# Altium footprint library TarabusLib_KOR.PcbLib: 560 footprints (part 21 of 35)
Each footprint in its own frame and in the unit in brackets; x right, y up, seen from the top. Pads: shape width x height; smd on the part's side, far side on the other; paste and mask are expansions set on the pad; w line width, h text height; cw(c..) or ccw(c..) is an arc to the next point about the centre after c.
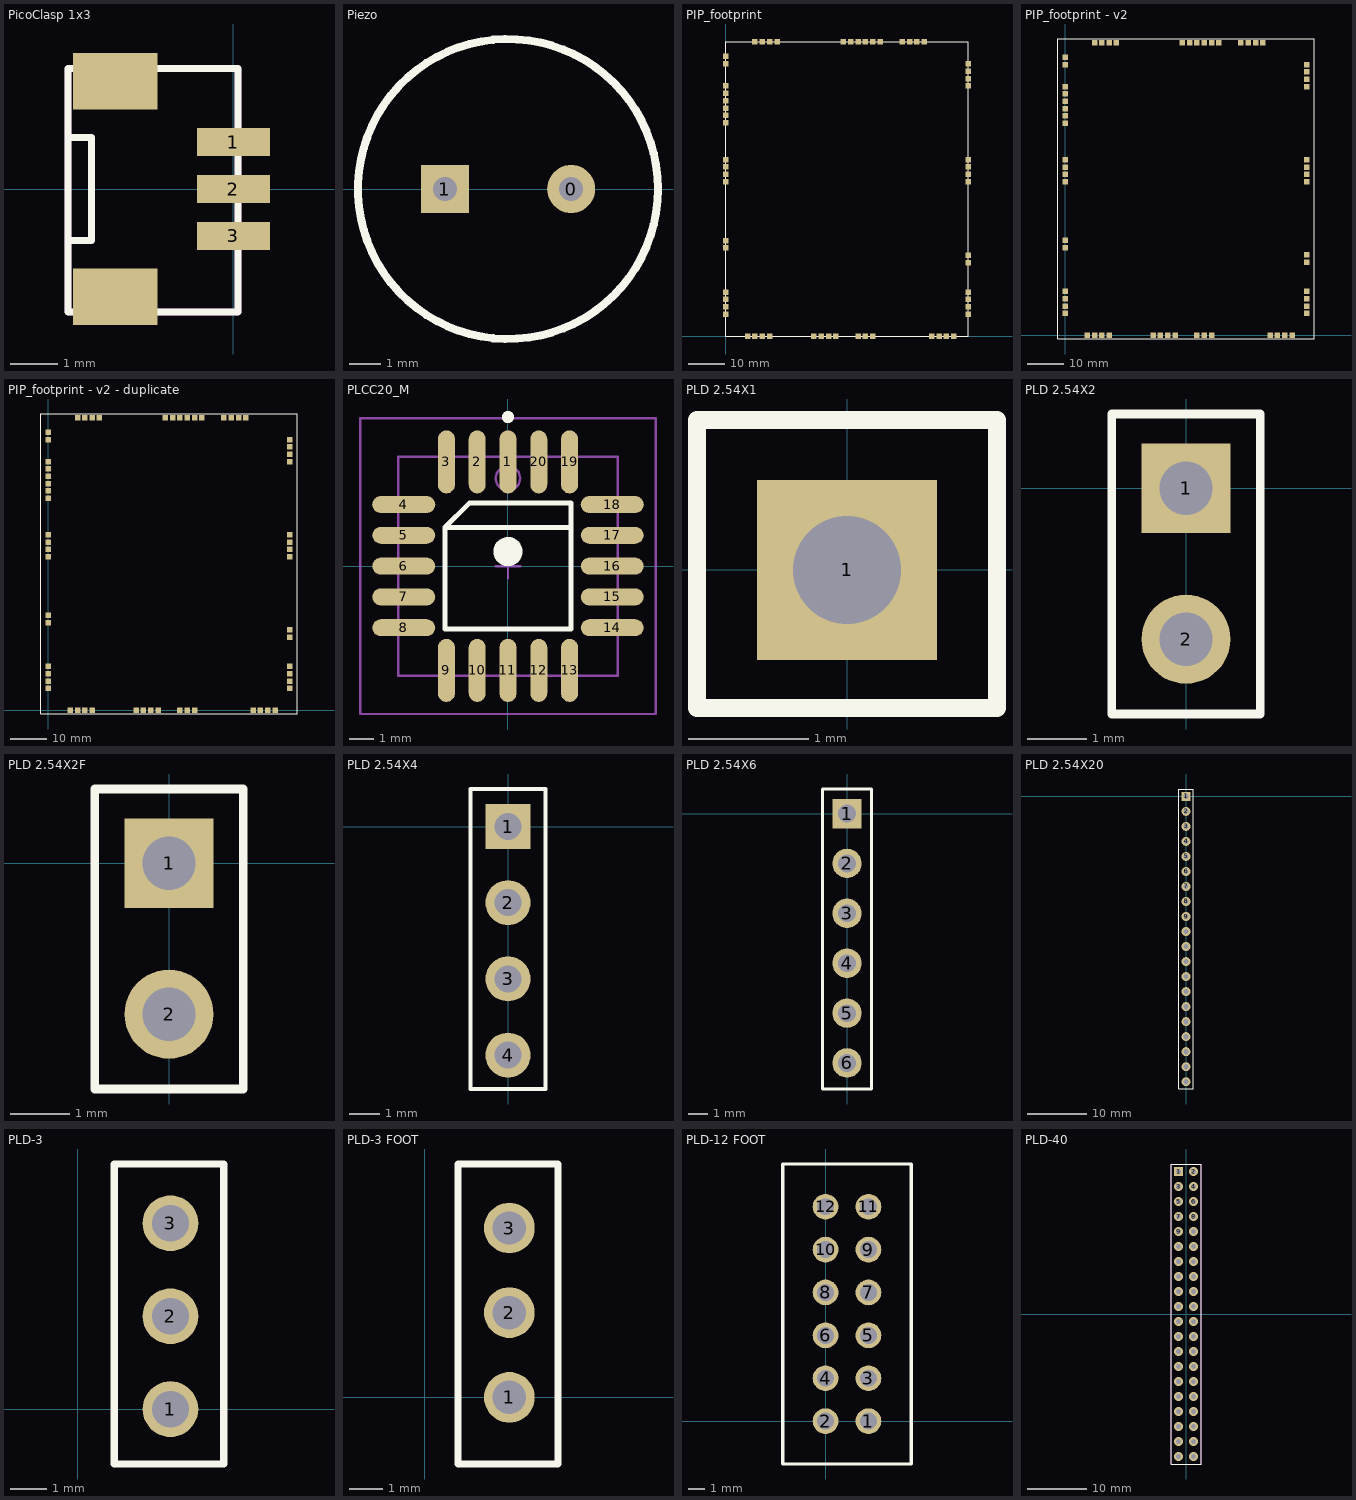
[diagram p20: the footprints below, top view; thin cyan lines are the x and y axes]

## PicoClasp 1x3 [mm]
pads (5):
  rect 1.55x0.6 smd: 1(0,1) 2(0,0) 3(0,-1)
  rect 1.8x1.2 smd: ""(-2.525,-2.3) ""(-2.525,2.3)
Top Overlay:
  lines w0.15: -3.525,-1.1 -3.025,-1.1 -3.025,1.1 -3.525,1.1 ; -3.525,-2.625 0.1,-2.625 0.1,2.575 -3.525,2.575 -3.525,-2.625
Mechanical 7:
  lines w0.15: -3.525,-1.075 -3.5,-1.1 -3.025,-1.1 -3.025,1.1 -3.525,1.1 ; -3.525,-2.625 0.1,-2.625 0.1,2.575 -3.525,2.575 -3.525,-2.625
Mechanical 10:
  text ".Designator" at -4,5 h0.6
  text ".Comment" at -4,4 h0.6
3D body "5013310307.stp": height 5.45, standoff 0, extent -3.5,-2.62 0.1,2.62

## Piezo [mil]
pads (2):
  round 60 hole 30: 0(-196.85,0)
  rect 60x60 hole 30: 1(-354.33,0)
Top Overlay:
  circle w10: c-275.59,0 r187.01
3D body "HC0903F.STEP": height 268.11, standoff -145.67, extent -462.59,-187 -88.58,187.01

## PIP_footprint [mm]
pads (61):
  rect 1.5x1.5 smd: 0(0,6) 0(0,8) 0(0,10) 0(0,12) 0(0,42) 0(0,44) 0(0,46) 0(0,48) 0(6,0) 0(8,0) 0(8,80) 0(10,0) 0(10,80) 0(12,0) 0(12,80) 0(14,80) 0(24,0) 0(26,0) 0(28,0) 0(30,0) 0(36,0) 0(38,0) 0(40,0) 0(56,0) 0(58,0) 0(60,0) 0(62,0) 0(66,6) 0(66,8) 0(66,10) 0(66,12) 0(66,42) 0(66,44) 0(66,46) 0(66,48) 0(66,68) 0(66,70) 0(66,72) 0(66,74) 1(0,24) 2(0,26) 3(0,66) 4(0,68) 5(0,74) 6(0,76) 7(0,64) 8(0,62) 9(0,58) 10(0,60) 11(42,80) 12(38,80) 13(40,80) 14(36,80) 15(32,80) 16(34,80) 17(52,80) 18(54,80) 19(48,80) 20(50,80) 21(66,20) 22(66,22)
Top Overlay:
  lines w0.1: 0,0 66,0 66,80 0,80 0,0
3D body "КПТВ.431328.003.step": height 4.15, standoff -0.82, extent 0,0 66,80

## PIP_footprint - v2 [mm]
pads (61):
  rect 1.5x1.5 smd: 0(0,42) 0(0,44) 0(0,46) 0(0,48) 0(8,80) 0(10,80) 0(12,80) 0(14,80) 0(62,0) 0(66,6) 0(66,8) 0(66,10) 0(66,12) 0(66,42) 0(66,44) 0(66,46) 0(66,48) 0(66,68) 0(66,70) 0(66,72) 0(66,74) 1(0,24) 2(0,26) 3(0,66) 4(0,68) 5(0,74) 6(0,76) 7(0,64) 8(0,62) 9(0,58) 10(0,60) 11(42,80) 12(38,80) 13(40,80) 14(36,80) 15(32,80) 16(34,80) 17(52,80) 18(54,80) 19(48,80) 20(50,80) 21(66,20) 22(66,22) 23(30,0) 24(24,0) 25(28,0) 26(26,0) 27(0,6) 28(6,0) 29(8,0) 30(10,0) 31(12,0) 32(60,0) 33(58,0) 34(56,0) 35(36,0) 36(0,12) 37(0,10) 38(0,8) 39(38,0) 40(40,0)
Top Overlay:
  lines w0.1: -2,-1 -2,81 68,81 68,-1 -2,-1
3D body "КПТВ.431328.003.step": height 5.15, standoff 0.18, extent 0,0 66,80

## PIP_footprint - v2 - duplicate [mm]
pads (61):
  rect 1.5x1.5 smd: 0(0,42) 0(0,44) 0(0,46) 0(0,48) 0(8,80) 0(10,80) 0(12,80) 0(14,80) 0(62,0) 0(66,6) 0(66,8) 0(66,10) 0(66,12) 0(66,42) 0(66,44) 0(66,46) 0(66,48) 0(66,68) 0(66,70) 0(66,72) 0(66,74) 1(0,24) 2(0,26) 3(0,66) 4(0,68) 5(0,74) 6(0,76) 7(0,64) 8(0,62) 9(0,58) 10(0,60) 11(42,80) 12(38,80) 13(40,80) 14(36,80) 15(32,80) 16(34,80) 17(52,80) 18(54,80) 19(48,80) 20(50,80) 21(66,20) 22(66,22) 23(30,0) 24(24,0) 25(28,0) 26(26,0) 27(0,6) 28(6,0) 29(8,0) 30(10,0) 31(12,0) 32(60,0) 33(58,0) 34(56,0) 35(36,0) 36(0,12) 37(0,10) 38(0,8) 39(38,0) 40(40,0)
Top Overlay:
  lines w0.1: -2,-1 68,-1 68,81 -2,81 -2,-1
3D body "КПТВ.431328.003.step": height 4.15, standoff -1.04, extent 0.167,-0.081 66.167,79.919

## PLCC20_M [mm] "20-Pin Leaded Chip Carrier 1.27 mm Pitch, IPC Low Density"
height 4.57
pads (20):
  oval 0.7x2.6 smd: 1(0,4.3) 2(-1.27,4.3) 3(-2.54,4.3) 9(-2.54,-4.3) 10(-1.27,-4.3) 11(0,-4.3) 12(1.27,-4.3) 13(2.54,-4.3) 19(2.54,4.3) 20(1.27,4.3)
  oval 2.6x0.7 smd: 4(-4.3,2.54) 5(-4.3,1.27) 6(-4.3,0) 7(-4.3,-1.27) 8(-4.3,-2.54) 14(4.3,-2.54) 15(4.3,-1.27) 16(4.3,0) 17(4.3,1.27) 18(4.3,2.54)
Top Overlay:
  circle w0.6: c0,0.6 r0.3
  circle w0.25: c0,6.15 r0.125
  lines w0.2: 2.6,1.6 -2.6,1.6 ; -2.6,1.6 -2.6,-2.6 2.6,-2.6 2.6,2.6 -1.6,2.6 -2.6,1.6
Mechanical 13:
  circle w0.1: c0,3.62 r0.5
  lines w0.1: -4.52,-4.52 4.52,-4.52 4.52,4.52 -4.52,4.52 -4.52,-4.52
Mechanical 15:
  lines w0.1: -0.5,0 0.5,0 ; 0,-0.5 0,0.5 ; -6.1,-6.1 6.1,-6.1 6.1,6.1 -6.1,6.1 -6.1,-6.1
3D body: height 4.57, standoff 0, extent -4.52,-4.52 4.52,4.52

## PLD 2.54X1 [mm]
pads (1):
  rect 1.5x1.5 hole 0.9: 1(0,0)
Top Overlay:
  lines w0.15: -1.25,-1.15 -1.25,1.25 1.25,1.25 1.25,-1.15 -1.25,-1.15

## PLD 2.54X2 [mm]
pads (2):
  rect 1.5x1.5 hole 0.9: 1(0,0)
  round 1.5 hole 0.9: 2(0,-2.54)
Top Overlay:
  lines w0.15: -1.25,-3.8 -1.25,1.25 1.25,1.25 1.25,-3.8 -1.25,-3.8

## PLD 2.54X2F [mm]
pads (2):
  rect 1.5x1.5 hole 0.9: 1(0,0)
  round 1.5 hole 0.9: 2(0,-2.54)
Top Overlay:
  lines w0.15: -1.25,-3.8 1.25,-3.8 1.25,1.25 -1.25,1.25 -1.25,-3.8
3D body "User Library-PLD-2.step": height 8.5, standoff -3, extent -1.27,-3.8 1.27,1.2

## PLD 2.54X4 [mm]
pads (4):
  rect 1.5x1.5 hole 0.9: 1(0,0)
  round 1.5 hole 0.9: 2(0,-2.54) 3(0,-5.08) 4(0,-7.62)
Top Overlay:
  lines w0.15: -1.25,-8.75 1.25,-8.75 1.25,1.25 -1.25,1.25 -1.25,-8.75

## PLD 2.54X6 [mm]
pads (6):
  rect 1.5x1.5 hole 0.9: 1(0,0)
  round 1.5 hole 0.9: 2(0,-2.54) 3(0,-5.08) 4(0,-7.62) 5(0,-10.16) 6(0,-12.7)
Top Overlay:
  lines w0.15: -1.25,-14.025 -1.25,1.25 1.25,1.25 1.25,-14.025 -1.25,-14.025

## PLD 2.54X20 [mm]
pads (20):
  rect 1.5x1.5 hole 0.9: 1(0,0)
  round 1.5 hole 0.9: 2(0,-2.54) 3(0,-5.08) 4(0,-7.62) 5(0,-10.16) 6(0,-12.7) 7(0,-15.24) 8(0,-17.78) 9(0,-20.32) 10(0,-22.86) 11(0,-25.4) 12(0,-27.94) 13(0,-30.48) 14(0,-33.02) 15(0,-35.56) 16(0,-38.1) 17(0,-40.64) 18(0,-43.18) 19(0,-45.72) 20(0,-48.26)
Top Overlay:
  lines w0.15: -1.25,-49.5 -1.25,1.25 1.25,1.25 1.25,-49.5 -1.25,-49.5
3D body: height 5, standoff 1, extent -1.25,-49.5 1.25,1.25

## PLD-3 [mil]
pads (3):
  round 60 hole 39.37: 1(100,0) 2(100,100) 3(100,200)
Top Overlay:
  lines w7.87: 39.37,-59.06 157.48,-59.06 157.48,263.78 39.37,263.78 39.37,-59.06
Mechanical 9:
  text ".Designator" at 35.43,283.46 h39.37
  text ".Comment" at 39.37,326.77 h39.37
3D body "User Library-PLD-3.step": height 338.58, standoff -119.69, extent 49.41,-45.66 149.41,254.34

## PLD-3 FOOT [mil]
pads (3):
  round 60 hole 39.37: 1(100,0) 2(100,100) 3(100,200)
Top Overlay:
  lines w7.87: 39.37,-78.74 39.37,275.59 157.48,275.59 157.48,-78.74 39.37,-78.74
Mechanical 10:
  text ".Comment" at -295.28,673.23 h39.37
  text ".Designator" at -299.21,629.92 h39.37

## PLD-12 FOOT [mil]
pads (12):
  round 60 hole 39.37: 1(100,0) 2(0,0) 3(100,100) 4(0,100) 5(100,200) 6(0,200) 7(100,300) 8(0,300) 9(100,400) 10(0,400) 11(100,500) 12(0,500)
Top Overlay:
  lines w7.87: -100,-100 -100,599.61 200,599.61 200,-100 -100,-100
Mechanical 10:
  text ".Comment" at -295.28,673.23 h39.37
  text ".Designator" at -299.21,629.92 h39.37
3D body "User Library-APC_220_1.STEP": height 334.65, standoff -347.95, extent -2584.65,-1009.84 13.78,1352.37

## PLD-40 [mm]
height 0.05
pads (40):
  rect 1.5x1.5 hole 0.9: 1(-1.27,24.13)
  round 1.5 hole 0.9: 2(1.27,24.13) 3(-1.27,21.59) 4(1.27,21.59) 5(-1.27,19.05) 6(1.27,19.05) 7(-1.27,16.51) 8(1.27,16.51) 9(-1.27,13.97) 10(1.27,13.97) 11(-1.27,11.43) 12(1.27,11.43) 13(-1.27,8.89) 14(1.27,8.89) 15(-1.27,6.35) 16(1.27,6.35) 17(-1.27,3.81) 18(1.27,3.81) 19(-1.27,1.27) 20(1.27,1.27) 21(-1.27,-1.27) 22(1.27,-1.27) 23(-1.27,-3.81) 24(1.27,-3.81) 25(-1.27,-6.35) 26(1.27,-6.35) 27(-1.27,-8.89) 28(1.27,-8.89) 29(-1.27,-11.43) 30(1.27,-11.43) 31(-1.27,-13.97) 32(1.27,-13.97) 33(-1.27,-16.51) 34(1.27,-16.51) 35(-1.27,-19.05) 36(1.27,-19.05) 37(-1.27,-21.59) 38(1.27,-21.59) 39(-1.27,-24.13) 40(1.27,-24.13)
Top Overlay:
  lines w0.15: -2.54,-25.4 -2.54,25.4 2.54,25.4 2.54,-25.4 -2.54,-25.4
Mechanical 7:
  lines w0.1: -2.54,-25.4 2.54,-25.4 2.54,25.4 -2.54,25.4 -2.54,-25.4
Mechanical 10:
  text ".Designator" at -0.54,26.67 h0.8
  text ".Comment" at -0.43,25.94 h0.6
3D body: height 0.05, standoff 0, extent -2.54,-25.4 2.54,25.4